# Altium footprint library IC.PcbLib: 115 footprints (part 1 of 8)
Each footprint in its own frame and in the unit in brackets; x right, y up, seen from the top. Pads: shape width x height; smd on the part's side, far side on the other; paste and mask are expansions set on the pad; w line width, h text height; cw(c..) or ccw(c..) is an arc to the next point about the centre after c.
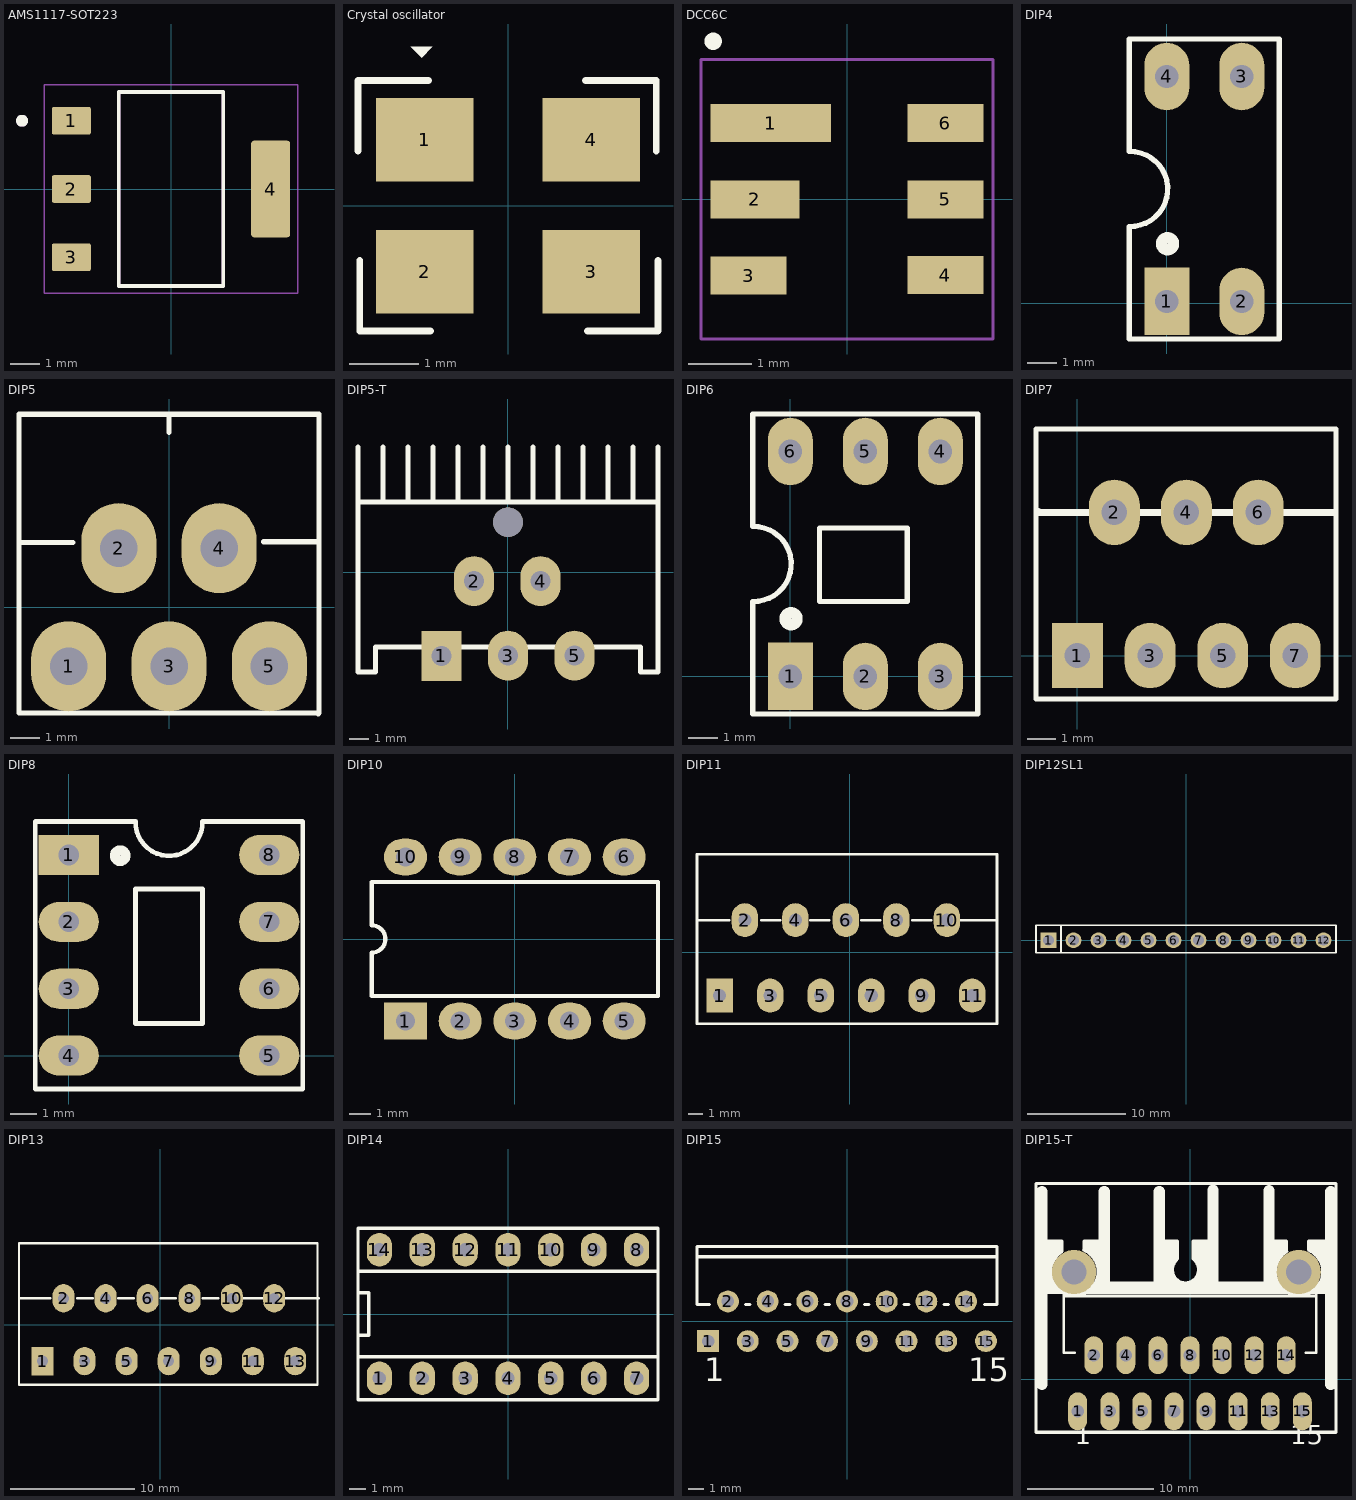
[diagram p0: the footprints below, top view; thin cyan lines are the x and y axes]

## AMS1117-SOT223 [mm]
height 1.8
pads (4):
  rrect15% 1.31x0.93 smd: 1(-3.345,2.29) 2(-3.345,0) 3(-3.345,-2.29)
  rrect15% 1.31x3.24 smd: 4(3.345,0)
Top Overlay:
  circle w0.2: c-5,2.29 r0.1
  lines w0.127: -1.753,-3.253 -1.753,3.253 1.753,3.253 1.753,-3.253 -1.753,-3.253
Mechanical 13:
  circle w0.2: c-5,2.29 r0.1
  lines w0.127: -1.753,-3.253 -1.753,3.253 1.753,3.253 1.753,-3.253 -1.753,-3.253
Mechanical 15:
  lines w0.05: -4.25,-3.502 4.25,-3.502 4.25,3.502 -4.25,3.502 -4.25,-3.502
3D body "step_temp.STEP": height 1.8, standoff 0, extent -3.499,-3.251 3.499,3.251

## Crystal oscillator [mm] "3225( 3.2x2.5mm) - 32mhz - 4pin"
pads (4):
  rect 1.4x1.2 smd: 1(-1.2,0.95) 2(-1.2,-0.95) 3(1.2,-0.95) 4(1.2,0.95)
Top Overlay:
  region: -1.397,2.286 -1.092,2.286 -1.245,2.134
  lines w0.1: -2.159,0.787 -2.159,1.803 -1.143,1.803 ; -2.134,-0.787 -2.134,-1.803 -1.118,-1.803 ; 1.118,1.803 2.134,1.803 2.134,0.787 ; 1.143,-1.803 2.159,-1.803 2.159,-0.787
3D body "TSX-3225.STEP": height 0.6, standoff 0, extent -1.6,-1.25 1.6,1.25

## DCC6C [mm] "SAW FILTER  3.0 x 3.0 mm"
pads (6):
  rect 1.9x0.6 smd: 1(-1.2,1.2)
  rect 1.4x0.6 smd: 2(-1.45,0)
  rect 1.2x0.6 smd: 3(-1.55,-1.2) 4(1.55,-1.194) 5(1.55,0) 6(1.55,1.2)
Top Overlay:
  circle w0.2: c-2.108,2.489 r0.036
Mechanical 7:
  lines w0.05: -2.3,-2.2 2.3,-2.2 2.3,2.2 -2.3,2.2 -2.3,-2.2
3D body "FL_AFS434S3_ABR.step": height 1.5, standoff 0, extent -2.007,-2.007 2.007,2.007

## DIP4 [mil] "W.300/L.400"
height 220.08
pads (4):
  rect 60x90 hole 31: 1(0,2.52)
  oval 60x90 hole 31: 2(100,2.52) 3(100,302.52) 4(0,302.52)
Top Overlay:
  circle w15: c1,79.52 r8
  lines w7: -50.38,102.57 ccw(c-48.68,152.54) -50,202.52 ; -50,102.52 -50,-47.48 150,-47.48 150,352.52 -50,352.52 -50,203.52
3D body "SW3DPS-DIP4-DEFAULT.STEP": height 169.69, standoff -129.13, extent -59.05,-7.48 159.06,307.48

## DIP5 [mm]
pads (5):
  oval 2.54x3.048 hole 1.27: 1(-3.4,-2) 2(-1.7,2) 3(0,-2) 4(1.7,2) 5(3.4,-2)
Top Overlay:
  lines w0.178: -5.076,2.191 -3.248,2.191 ; 0,5.918 0,6.502 ; 3.204,2.216 5.033,2.216 ; -5.08,-3.581 -5.08,6.534 5.08,6.534 5.08,-3.581 5.055,-3.607 5.029,-3.581 -5.08,-3.581
3D body "TO220-5.STEP": height 18.81, standoff -9.47, extent -4.993,-2.246 5.207,6.31

## DIP5-T [mil]
pads (6):
  rect 80x100 hole 40: 1(-132,-167.09)
  oval 80x100 hole 40: 2(-67,-18) 3(1,-167) 4(66,-18) 5(134,-167)
  round 59.06 hole 59.06: ""(1,100)
Top Overlay:
  lines w10: -299,140 301,140 ; -299,250 -299,-200 -264,-200 -264,-150 266,-150 266,-200 301,-200 301,250 ; -249,140 -249,250 ; -199,140 -199,250 ; -149,140 -149,250 ; -99,140 -99,250 ; -49,140 -49,250 ; 1,140 1,250 ; 51,140 51,250 ; 101,140 101,250 ; 151,140 151,250 ; 201,140 201,250 ; 251,140 251,250
3D body "SW3dPS-TO220-5.STEP": height 859.05, standoff -85.43, extent -199,-174.91 201,149.5

## DIP6 [mil] "6 PIN, W 300mil, Pin to pin 100mil"
height 100
pads (6):
  rect 60x90 hole 31.5: 1(0,0)
  oval 60x90 hole 31.5: 2(100,0) 3(200,0) 4(200,300) 5(100,300) 6(0,300)
Top Overlay:
  circle w15: c1,77 r8
  lines w7: -50.38,100.05 ccw(c-48.69,150.02) -50,200 ; -50,100 -50,-50 250,-50 250,350 -50,350 -50,201 ; 39,100 156,100 156,198 39,198 39,100
3D body "SW3DPS-DIP6-DEFAULT.STEP": height 169.69, standoff -129.13, extent -58.11,-7.48 260,307.48

## DIP7 [mil]
pads (7):
  rect 70x90 hole 35: 1(0,0)
  oval 70x90 hole 35: 2(51,197) 3(100,0) 4(150,197) 5(200,0) 6(249,197) 7(300,0)
Top Overlay:
  lines w7: -57,-60 356,-60 356,312 -57,312 -57,-60
  lines w10: -54,198 -54,197 354,197
3D body "User Library-TO-220(T).STEP": height 756.77, standoff -77.87, extent -50.57,-11.02 351,311.02

## DIP8 [mil] "8 PIN, Width 300mil, Pin to pin 100mil"
height 100
pads (8):
  rect 90x60 hole 31: 1(0,300)
  oval 90x60 hole 31: 2(0,200) 3(0,100) 4(0,0) 5(300,0) 6(300,100) 7(300,200) 8(300,300)
Top Overlay:
  circle w15: c77,299 r8
  lines w7: 100,350 -50,350 -50,-50 350,-50 350,350 201,350 ; 100.05,350.38 ccw(c150.02,348.69) 200,350 ; 100,48 100,249 200,249 200,48 100,48
3D body "SW3dPS-DIP8-CER.STEP": height 201.25, standoff -129.47, extent -40,-50 336.4,350

## DIP10 [mm] "DIP; 10 Leads; Row Spacing 7.62 mm; Pitch 2.54 mm"
height 4.42
pads (10):
  rect 2x1.7 hole 0.9: 1(-5.08,-3.81)
  oval 2x1.7 hole 0.9: 2(-2.54,-3.81) 3(0,-3.81) 4(2.54,-3.81) 5(5.08,-3.81) 6(5.08,3.81) 7(2.54,3.81) 8(0,3.81) 9(-2.54,3.81) 10(-5.08,3.81)
Top Overlay:
  lines w0.2: -6.65,-2.65 -6.65,-0.635 ccw(c-6.65,0) -6.65,0.635 -6.65,2.65 6.65,2.65 6.65,-2.65 -6.65,-2.65

## DIP11 [mil]
pads (11):
  rect 70x90 hole 35: 1(-345,-115)
  oval 70x90 hole 35: 2(-278.07,85) 3(-211.14,-115) 4(-144.21,85) 5(-77.28,-115) 6(-10.35,85) 7(56.57,-115) 8(123.5,85) 9(190.43,-115) 10(257.36,85) 11(324.29,-115)
Top Overlay:
  lines w7: -405,85 -320,85 ; -235,85 -185,85 ; -105,85 -55,85 ; 30,85 80,85 ; 165,85 215,85 ; 285,85 390,85 ; -405,-190 -405,260 390,260 390,-190 -405,-190
3D body "User Library-TDA 2004R.step": height 826.77, standoff -138.19, extent -404.09,-120 384.09,252.82

## DIP12SL1 [mm]
height 8.54
pads (12):
  rect 1.6x1.6 hole 1.1: 1(-13.97,0)
  round 1.6 hole 1.1: 2(-11.43,0) 3(-8.89,0) 4(-6.35,0) 5(-3.81,0) 6(-1.27,0) 7(1.27,0) 8(3.81,0) 9(6.35,0) 10(8.89,0) 11(11.43,0) 12(13.97,0)
Top Overlay:
  lines w0.2: -12.7,-1.27 -12.7,1.397 ; -15.24,-1.27 -15.24,1.524 -13.081,1.524 15.24,1.524 15.24,-1.27 -15.24,-1.27
3D body "61301211121.stp": height 10.17, standoff -1.37, extent -15.24,-1.27 15.24,1.27
3D body: height 12, standoff 4.5, extent -15.367,-1.397 15.24,1.524
3D body: height 18, standoff 8, extent -14.986,1.27 14.859,1.651

## DIP13 [mil]
pads (13):
  rect 70x90 hole 35: 1(-375,-115)
  oval 70x90 hole 35: 2(-308.07,85) 3(-241.14,-115) 4(-174.21,85) 5(-107.28,-115) 6(-40.35,85) 7(26.57,-115) 8(93.5,85) 9(160.43,-115) 10(227.36,85) 11(294.29,-115) 12(362.36,85) 13(429.29,-115)
Top Overlay:
  lines w7: -450,85 -350,85 ; -265,85 -215,85 ; -135,85 -85,85 ; 0,85 50,85 ; 135,85 185,85 ; 255,85 505,85 ; -450,-190 500,-190 500,-170 500,20 500,260 -450,260 -450,-190
3D body "User Library-TDA1518BQ.step": height 712.6, standoff -109.15, extent -447.44,-125 497.44,254.14

## DIP14 [mm] "W.300/L.900"
height 5.59
pads (14):
  oval 1.5x2 hole 0.8: 1(-7.62,-3.81) 2(-5.08,-3.81) 3(-2.54,-3.81) 4(0,-3.81) 5(2.54,-3.81) 6(5.08,-3.81) 7(7.62,-3.81) 8(7.62,3.81) 9(5.08,3.81) 10(2.54,3.81) 11(0,3.81) 12(-2.54,3.81) 13(-5.08,3.81) 14(-7.62,3.81)
Top Overlay:
  lines w0.203: -8.89,-2.54 -8.89,-1.27 ; -8.89,-2.54 -8.89,-1.27 ; -8.89,-2.54 8.89,-2.54 ; -8.89,-2.54 8.89,-2.54 ; -8.89,-1.27 -8.255,-1.27 ; -8.89,-1.27 -8.89,1.27 ; -8.89,-1.27 -8.255,-1.27 ; -8.89,-1.27 -8.89,1.27 ; -8.89,1.27 -8.255,1.27 ; -8.89,1.27 -8.89,2.54 ; -8.89,1.27 -8.255,1.27 ; -8.89,1.27 -8.89,2.54 ; -8.89,2.54 8.89,2.54 ; -8.89,2.54 8.89,2.54 ; -8.255,-1.27 -8.255,1.27 ; -8.255,-1.27 -8.255,1.27 ; 8.89,-2.54 8.89,2.54 ; -8.89,-5.08 8.89,-5.08 8.89,5.08 -8.89,5.08 -8.89,-5.08
3D body "User Library-DIP14-300-metric.step": height 4.5, standoff -3.5, extent -9.05,-3.88 9.05,3.88

## DIP15 [mm] "TO, Thru-Hole, Vertical, Heatsink Mounted; 15 Bent Staggered Leads; Pitch 1.27 mm"
height 17.3
pads (15):
  rect 1.4x1.4 hole 0.8: 1(-8.89,-1.27)
  round 1.4 hole 0.8: 2(-7.62,1.27) 3(-6.35,-1.27) 4(-5.08,1.27) 5(-3.81,-1.27) 6(-2.54,1.27) 7(-1.27,-1.27) 8(0,1.27) 9(1.27,-1.27) 10(2.54,1.27) 11(3.81,-1.27) 12(5.08,1.27) 13(6.35,-1.27) 14(7.62,1.27) 15(8.89,-1.27)
Top Overlay:
  lines w0.2: -9.6,4.13 9.6,4.13 ; -8.8,1.08 -9.6,1.08 -9.6,4.78 9.6,4.78 9.6,1.08 8.8,1.08 ; -6.5,1.08 -6.2,1.08 ; -3.96,1.08 -3.66,1.08 ; -1.42,1.08 -1.12,1.08 ; 1.12,1.08 1.42,1.08 ; 3.66,1.08 3.96,1.08 ; 6.2,1.08 6.5,1.08
  text "15" at 7.765,-3.845 h1.5
  text "1" at -9.14,-3.845 h1.5
3D body "User Library-MULTIWAT T15.step": height 22.74, standoff -2.18, extent -9.8,-1.778 9.8,7.29

## DIP15-T [mm]
height 21
pads (17):
  oval 1.5x3 hole 1: 1(-8.89,-2.54) 2(-7.62,1.905) 3(-6.35,-2.54) 4(-5.08,1.905) 5(-3.81,-2.54) 6(-2.54,1.905) 7(-1.27,-2.54) 8(0,1.905) 9(1.27,-2.54) 10(2.54,1.905) 11(3.81,-2.54) 12(5.08,1.905) 13(6.35,-2.54) 14(7.62,1.905) 15(8.89,-2.54)
  round 3.5 hole 2: ""(-9.178,8.484) ""(8.602,8.484)
Top Overlay:
  region: 0.127,10.922 1.651,10.922 1.651,7.366 1.397,7.62 0.127,7.62 0.635,8.128 0.635,9.144 0.127,9.652
  region: -2.159,10.922 -0.889,10.922 -0.889,9.652 -1.397,9.144 -1.397,8.128 -0.889,7.62 -2.159,7.62
  region: -8.382,10.922 -8.382,10.287 -7.874,9.779 -7.747,9.779 -7.493,9.525 -7.493,9.271 -7.366,9.144 -7.366,7.62 -6.731,7.62 -6.604,7.747 -6.985,8.128 -6.985,10.922
  region: -11.43,10.922 -10.16,10.922 -10.16,10.033 -10.287,10.033 -10.795,9.525 -10.795,9.271 -11.049,9.017 -11.049,8.128 -10.922,8.001 -10.922,7.62 -11.43,7.62
  region: 6.35,10.922 7.62,10.922 7.62,10.033 7.493,10.033 6.985,9.525 6.985,9.271 6.731,9.017 6.731,8.128 6.858,8.001 6.858,7.62 6.35,7.62
  region: 9.398,10.922 9.398,10.287 9.906,9.779 10.033,9.779 10.287,9.525 10.287,9.271 10.414,9.144 10.414,7.62 11.049,7.62 11.176,7.747 10.795,8.128 10.795,10.922
  lines w0.2: -10,6.59 10,6.59 ; -9.144,2.09 -10,2.09 -10,7.09 10,7.09 10,2.09 9.144,2.09
  lines w0.254: -11.43,10.922 -10.16,10.922 -10.16,10.16 ; -10.127,10.106 ccw(c-9.144,8.509) -8.405,10.233 ; -9.863,9.144 ccw(c-9.123,8.403) -8.382,9.144 ; -8.382,10.287 -8.382,10.922 -7.112,10.922 ; -2.413,10.922 -1.016,10.922 -1.016,9.525 -1.143,9.398 ; -1.093,9.391 ccw(c-0.36,8.657) 0.374,9.391 ; 0.381,9.398 0.254,9.525 0.254,10.922 1.397,10.922 ; 6.35,10.922 7.62,10.922 7.62,10.16 ; 7.653,10.106 ccw(c8.636,8.509) 9.375,10.233 ; 9.398,10.287 9.398,10.922 10.668,10.922 ; -12.192,-4.191 11.557,-4.191 11.557,15.494 -12.192,15.494 -12.192,-4.191
  lines w0.889: -11.718,-0.406 -11.718,14.834 ; -6.782,7.341 -6.782,14.859 ; -2.438,7.341 -2.438,14.859 ; 1.829,7.315 1.829,14.986 ; 6.248,7.315 6.248,14.935 ; 11.142,-0.406 11.142,14.834
  lines w1.016: -11.557,7.239 10.922,7.239
  text "1" at -9.12,-5.165 h1.5
  text "15" at 7.94,-5.165 h1.5
3D body "User Library-heat sink-1.STEP": height 30.64, standoff 0.02, extent -11.684,-1.143 11.216,15.257
3D body "User Library-MULTIWAT T15.step": height 22.74, standoff -2.18, extent -9.8,-2.815 9.8,6.253